# Altium footprint library MH_DA_THU_VIEN_16122016.PcbLib: 531 footprints (part 22 of 34)
Each footprint in its own frame and in the unit in brackets; x right, y up, seen from the top. Pads: shape width x height; smd on the part's side, far side on the other; paste and mask are expansions set on the pad; w line width, h text height; cw(c..) or ccw(c..) is an arc to the next point about the centre after c.
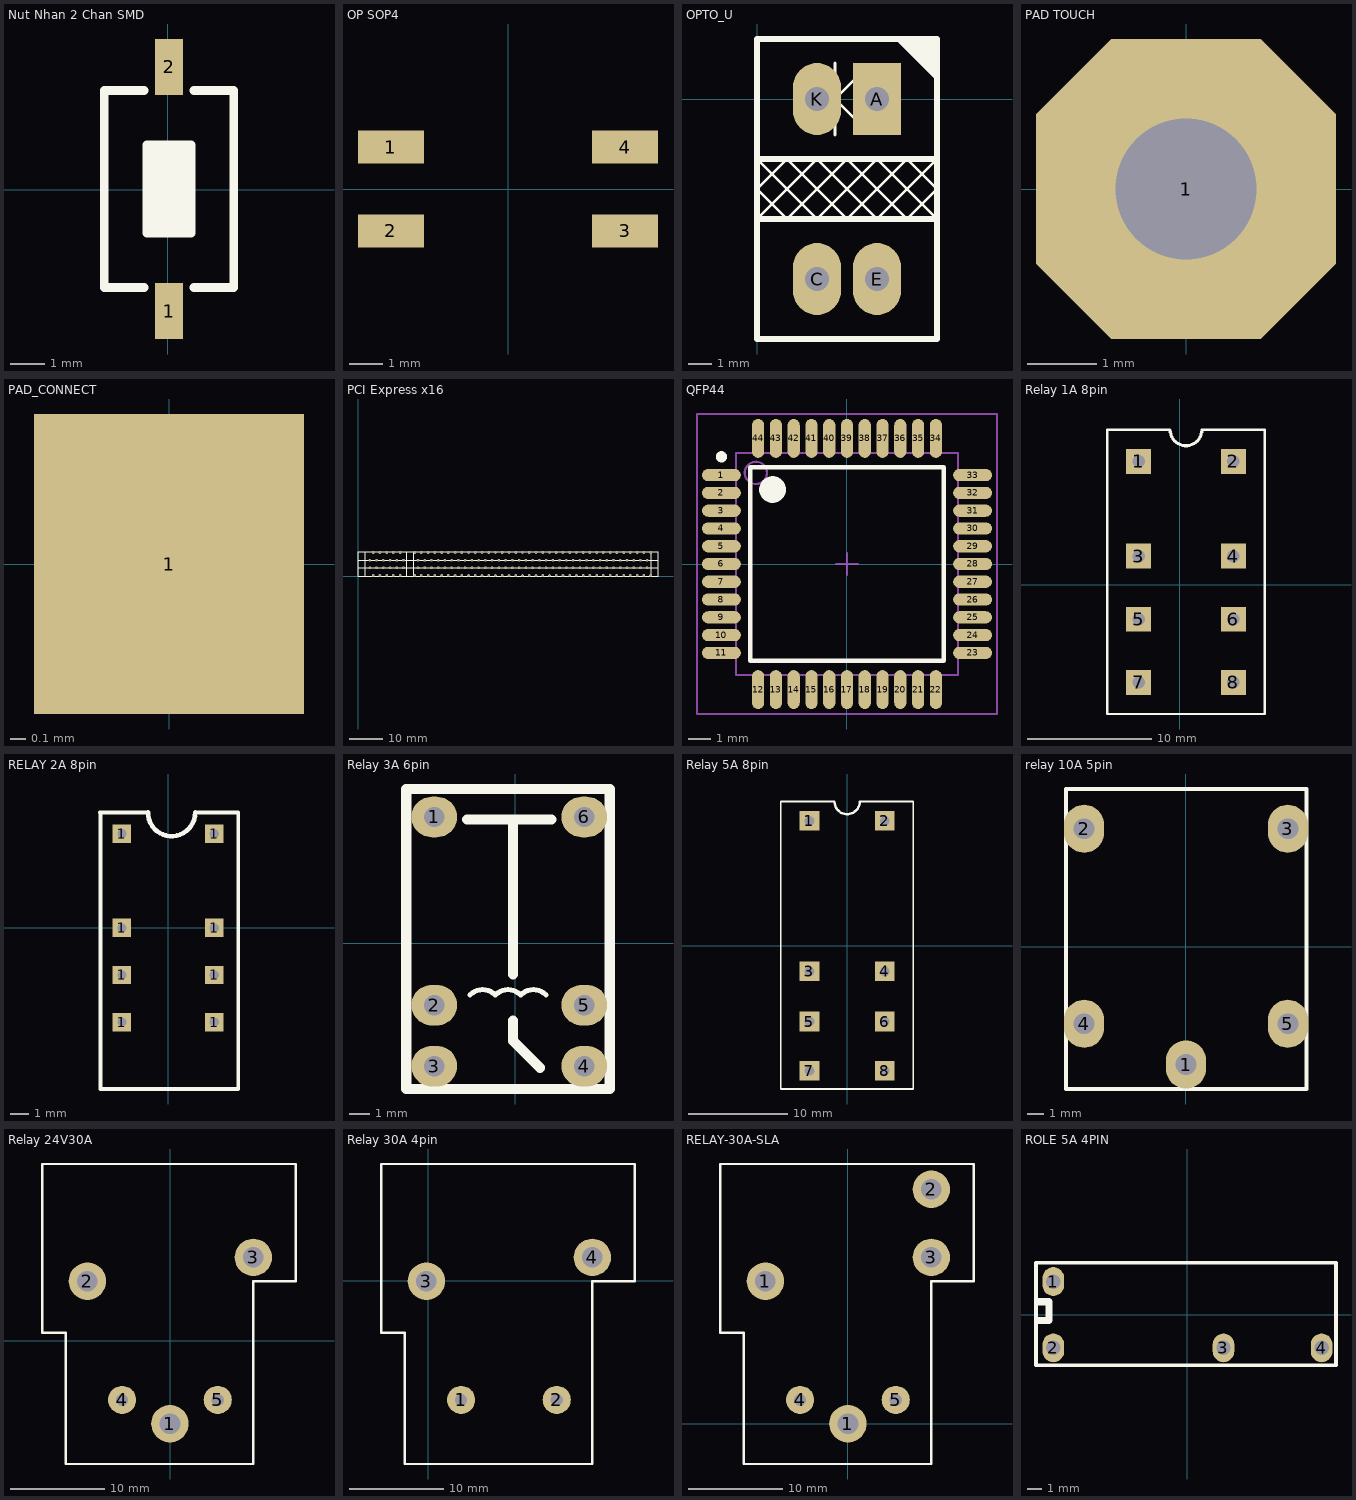
[diagram p21: the footprints below, top view; thin cyan lines are the x and y axes]

## Nut Nhan 2 Chan SMD [mm]
pads (2):
  rect 0.8x1.6 smd: 1(0.041,-3.484) 2(0.041,3.516)
Top Overlay:
  region: 0.676,-1.253 0.676,1.287 -0.594,1.287 -0.594,-1.253
  lines w0.254: -0.67,-2.803 -1.813,-2.803 -1.813,2.835 -0.67,2.835 ; 0.752,-2.803 1.895,-2.803 1.895,2.835 0.752,2.835 ; -0.594,-1.254 0.676,-1.254 0.676,1.286 -0.594,1.286 -0.594,-1.254
3D body: height 2.5, standoff 0, extent -1.809,-3.034 1.891,3.066

## OP SOP4 [mm]
pads (4):
  rect 2x1 smd: 1(-3.556,1.27) 2(-3.556,-1.27) 3(3.556,-1.27) 4(3.556,1.27)
3D body: height 4.57, standoff 0, extent -3.048,-2.54 3.048,2.54

## OPTO_U [mil] "Opto hinh chu U"
height 104.33
pads (4):
  rect 80x120 hole 40: A(200,0)
  oval 80x120 hole 40: C(100,-300) E(200,-300) K(100,0)
Top Overlay:
  region: 297.5,97.5 232.5,97.5 297.5,32.5
  lines w5: 0,-200 50,-150 100,-100 200,-200 230,-170 300,-100 300,-200 200,-100 100,-200 90,-190 60,-160 0,-100 ; 130,-60 130,60 ; 180,-50 180,50 ; 180,-50 180,50 ; 180,-50 130,0 180,50 ; 0,-150 30,-180 50,-200 150,-100 250,-200 300,-150 250,-100 150,-200 50,-100 0,-150
  lines w10: 0,-200 300,-200 ; 0,-150 0,-110 ; 0,-100 300,-100 ; 300,-150 300,-140 ; 0,-400 300,-400 300,100 0,100 0,-400
3D body: height 374.02, standoff -100, extent 43.46,-346.85 260,46.85

## PAD TOUCH [mil]
pads (1):
  oct 170x170 hole 80: 1(0,0)

## PAD_CONNECT [mm]
pads (1):
  rect 1.8x2 smd: 1(0,0)

## PCI Express x16 [mm]
pads (164):
  round 0.8 hole 0.5: 1(3.5,2.5) 2(4.5,0.2) 3(5.5,2.5) 4(6.5,0.2) 5(7.5,2.5) 6(8.5,0.2) 7(9.5,2.5) 8(10.5,0.2) 9(11.5,2.5) 10(12.5,0.2) 11(13.5,2.5) 12(16.8,0.2) 13(17.8,2.5) 14(18.8,0.2) 15(19.8,2.5) 16(20.8,0.2) 17(21.8,2.5) 18(22.8,0.2) 19(23.8,2.5) 20(24.8,0.2) 21(25.8,2.5) 22(26.8,0.2) 23(27.8,2.5) 24(28.8,0.2) 25(29.8,2.5) 26(30.8,0.2) 27(31.8,2.5) 28(32.8,0.2) 29(33.8,2.5) 30(34.8,0.2) 31(35.8,2.5) 32(36.8,0.2) 33(37.8,2.5) 34(38.8,0.2) 35(39.8,2.5) 36(40.8,0.2) 37(41.8,2.5) 38(42.8,0.2) 39(43.8,2.5) 40(44.8,0.2) 41(45.8,2.5) 42(46.8,0.2) 43(47.8,2.5) 44(48.8,0.2) 45(49.8,2.5) 46(50.8,0.2) 47(51.8,2.5) 48(52.8,0.2) 49(53.8,2.5) 50(54.8,0.2) 51(55.8,2.5) 52(56.8,0.2) 53(57.8,2.5) 54(58.8,0.2) 55(59.8,2.5) 56(60.8,0.2) 57(61.8,2.5) 58(62.8,0.2) 59(63.8,2.5) 60(64.8,0.2) 61(65.8,2.5) 62(66.8,0.2) 63(67.8,2.5) 64(68.8,0.2) 65(69.8,2.5) 66(70.8,0.2) 67(71.8,2.5) 68(72.8,0.2) 69(73.8,2.5) 70(74.8,0.2) 71(75.8,2.5) 72(76.8,0.2) 73(77.8,2.5) 74(78.8,0.2) 75(79.8,2.5) 76(80.8,0.2) 77(81.8,2.5) 78(82.8,0.2) 79(83.8,2.5) 80(84.8,0.2) 81(85.8,2.5) 82(86.8,0.2) A1(3.5,4.7) A2(4.5,7) A3(5.5,4.7) A4(6.5,7) A5(7.5,4.7) A6(8.5,7) A7(9.5,4.7) A8(10.5,7) A9(11.5,4.7) A10(12.5,7) A11(13.5,4.7) A12(16.8,7) A13(17.8,4.7) A14(18.8,7) A15(19.8,4.7) A16(20.8,7) A17(21.8,4.7) A18(22.8,7) A19(23.8,4.7) A20(24.8,7) A21(25.8,4.7) A22(26.8,7) A23(27.8,4.7) A24(28.8,7) A25(29.8,4.7) A26(30.8,7) A27(31.8,4.7) A28(32.8,7) A29(33.8,4.7) A30(34.8,7) A31(35.8,4.7) A32(36.8,7) A33(37.8,4.7) A34(38.8,7) A35(39.8,4.7) A36(40.8,7) A37(41.8,4.7) A38(42.8,7) A39(43.8,4.7) A40(44.8,7) A41(45.8,4.7) A42(46.8,7) A43(47.8,4.7) A44(48.8,7) A45(49.8,4.7) A46(50.8,7) A47(51.8,4.7) A48(52.8,7) A49(53.8,4.7) A50(54.8,7) A51(55.8,4.7) A52(56.8,7) A53(57.8,4.7) A54(58.8,7) A55(59.8,4.7) A56(60.8,7) A57(61.8,4.7) A58(62.8,7) A59(63.8,4.7) A60(64.8,7) A61(65.8,4.7) A62(66.8,7) A63(67.8,4.7) A64(68.8,7) A65(69.8,4.7) A66(70.8,7) A67(71.8,4.7) A68(72.8,7) A69(73.8,4.7) A70(74.8,7) A71(75.8,4.7) A72(76.8,7) A73(77.8,4.7) A74(78.8,7) A75(79.8,4.7) A76(80.8,7) A77(81.8,4.7) A78(82.8,7) A79(83.8,4.7) A80(84.8,7) A81(85.8,4.7) A82(86.8,7)
Top Overlay:
  lines w0.254: 0,2.5 89,2.5 89,4.7 0,4.7 ; 2.1,0 2.1,7.2 ; 16.5,0 16.5,7.2 ; 87,7.2 89,7.2 89,0 ; 87,7.2 87,0 89,0 ; 87,7.2 0,7.2 0,0 89,0 ; 14.5,0 14.5,7.2 14.5,0

## QFP44 [mm] "Thin QFP, 44-Leads, Body 10x10mm, Pitch 0.8mm, IPC Medium Density"
height 1.2
pads (44):
  oval 1.75x0.55 smd: 1(-5.65,4) 2(-5.65,3.2) 3(-5.65,2.4) 4(-5.65,1.6) 5(-5.65,0.8) 6(-5.65,0) 7(-5.65,-0.8) 8(-5.65,-1.6) 9(-5.65,-2.4) 10(-5.65,-3.2) 11(-5.65,-4) 23(5.65,-4) 24(5.65,-3.2) 25(5.65,-2.4) 26(5.65,-1.6) 27(5.65,-0.8) 28(5.65,0) 29(5.65,0.8) 30(5.65,1.6) 31(5.65,2.4) 32(5.65,3.2) 33(5.65,4)
  oval 0.55x1.75 smd: 12(-4,-5.65) 13(-3.2,-5.65) 14(-2.4,-5.65) 15(-1.6,-5.65) 16(-0.8,-5.65) 17(0,-5.65) 18(0.8,-5.65) 19(1.6,-5.65) 20(2.4,-5.65) 21(3.2,-5.65) 22(4,-5.65) 34(4,5.65) 35(3.2,5.65) 36(2.4,5.65) 37(1.6,5.65) 38(0.8,5.65) 39(0,5.65) 40(-0.8,5.65) 41(-1.6,5.65) 42(-2.4,5.65) 43(-3.2,5.65) 44(-4,5.65)
Top Overlay:
  circle w0.6: c-3.35,3.35 r0.3
  circle w0.25: c-5.65,4.825 r0.125
  lines w0.2: -4.35,-4.35 4.35,-4.35 4.35,4.35 -4.35,4.35 -4.35,-4.35
Mechanical 13:
  circle w0.1: c-4.1,4.1 r0.5
  lines w0.1: -5,-5 5,-5 5,5 -5,5 -5,-5
Mechanical 15:
  lines w0.1: -0.5,0 0.5,0 ; 0,-0.5 0,0.5 ; -6.75,-6.75 6.75,-6.75 6.75,6.75 -6.75,6.75 -6.75,-6.75

## Relay 1A 8pin [mm]
pads (8):
  rect 2x2 hole 1: 1(-3.3,9.94) 2(4.32,9.94) 3(-3.3,2.32) 4(4.32,2.32) 5(-3.3,-2.76) 6(4.32,-2.76) 7(-3.3,-7.84) 8(4.32,-7.84)
Top Overlay:
  lines w0.2: -0.887,12.48 -5.84,12.48 -5.84,-10.38 6.86,-10.38 6.86,12.48 1.78,12.48
  lines w0.254: -0.766,12.48 ccw(c0.51,12.48) 1.786,12.48
3D body: height 12.3, standoff -3, extent -4.39,-9.35 5.41,11.45

## RELAY 2A 8pin [mm]
pads (8):
  rect 1x1 hole 0.5: 1(-2.5,-5.1) 1(-2.5,-2.55) 1(-2.5,0) 1(-2.5,5.1) 1(2.5,-5.1) 1(2.5,-2.55) 1(2.5,0) 1(2.5,5.1)
Top Overlay:
  lines w0.2: -3.7,6.24 -1.207,6.24 ; -3.66,6.2 -3.66,-8.72 3.8,-8.72 3.8,6.2 ; 1.46,6.24 3.8,6.24
  lines w0.254: -1.086,6.24 ccw(c0.19,6.24) 1.466,6.24
3D body: height 9.2, standoff -2.95, extent -3.55,-8.7 3.75,6.1

## Relay 3A 6pin [mil]
pads (6):
  oval 90x80 hole 40: 1(-159.41,247.91) 2(-159.41,-122.09) 3(-159.41,-242.09) 4(135.59,-242.09) 5(135.59,-122.09) 6(135.59,247.91)
Top Overlay:
  lines w10: -89.41,-102.09 cw(c-64.41,-127.09) -39.41,-102.09 cw(c-14.41,-127.09) 10.59,-102.09 cw(c35.59,-127.09) 60.59,-102.09
  lines w20: -94.41,242.91 70.59,242.91 ; -4.41,-187.09 -4.41,-152.09 ; -4.41,-62.09 -4.41,242.91 ; -4.31,-191.09 -4.31,-192.59 48.49,-245.39 ; -214.41,-287.09 -214.41,302.91 185.59,302.91 185.59,-287.09 -214.41,-287.09
3D body: height 453.36, standoff 0.6, extent -214.33,-284.4 179.37,306.15

## Relay 5A 8pin [mm]
pads (8):
  rect 2x2 hole 1: 1(-3.81,12.64) 2(3.81,12.64) 3(-3.81,-2.58) 4(3.81,-2.58) 5(-3.81,-7.66) 6(3.81,-7.66) 7(-3.81,-12.64) 8(3.81,-12.64)
Top Overlay:
  lines w0.2: -1.397,14.58 -6.71,14.58 -6.71,-14.48 6.69,-14.48 6.69,14.58 1.27,14.58
  lines w0.254: -1.276,14.58 ccw(c0,14.58) 1.276,14.58
3D body: height 25.5, standoff -4, extent -6.66,-14.5 6.84,14.5

## relay 10A 5pin [mm]
pads (5):
  oval 2.5x3 hole 1.3: 1(0,-7.35) 2(-6.35,7.35) 3(6.35,7.35) 4(-6.35,-4.81) 5(6.35,-4.81)
Top Overlay:
  lines w0.254: -7.493,-8.874 -7.493,9.826 7.507,9.826 7.507,-8.874 -7.493,-8.874
3D body: height 16, standoff 0, extent -7.493,-8.874 7.493,9.795

## Relay 24V30A [mm]
pads (5):
  round 4 hole 2.2: 1(-0.05,-8.87) 2(-8.85,6.33) 3(8.85,8.87)
  round 3 hole 1.3: 4(-5.15,-6.33) 5(5.05,-6.33)
Top Overlay:
  lines w0.254: -11.15,0.83 -11.15,-13.17 8.85,-13.17 8.85,6.33 13.35,6.33 13.35,18.83 -13.65,18.83 -13.65,0.83 -11.15,0.83
3D body: height 19.71, standoff -3.29, extent -13.512,-13.237 13.488,18.763

## Relay 30A 4pin [mm]
pads (4):
  round 3 hole 1.3: 1(3.51,-12.69) 2(13.71,-12.69)
  round 4 hole 2.2: 3(-0.19,-0.03) 4(17.51,2.51)
Top Overlay:
  lines w0.254: -2.49,-5.53 -2.49,-19.53 17.51,-19.53 17.51,-0.03 22.01,-0.03 22.01,12.47 -4.99,12.47 -4.99,-5.53 -2.49,-5.53
3D body: height 19.71, standoff -3.29, extent -4.852,-19.597 22.148,12.403

## RELAY-30A-SLA [mm]
pads (6):
  round 4 hole 2.2: 1(-8.8,15.2) 1(0,0) 2(8.9,25) 3(8.9,17.74)
  round 3 hole 1.3: 4(-5.1,2.54) 5(5.1,2.54)
Top Overlay:
  lines w0.254: -13.6,9.7 -11.1,9.7 -11.1,-4.3 8.9,-4.3 8.9,15.2 13.4,15.2 13.4,27.7 -13.6,27.7 -13.6,9.7
3D body: height 19.71, standoff -3.29, extent -13.462,-4.367 13.538,27.633

## ROLE 5A 4PIN [mm]
pads (4):
  oval 1.5x2 hole 1: 1(-9.3,2.3) 2(-9.3,-2.3) 3(2.5,-2.3) 4(9.3,-2.3)
Top Overlay:
  lines w0.254: -10.5,-3.5 -10.5,3.6 10.3,3.6 10.3,-3.5 -10.5,-3.5
  lines w0.508: -10.4,0.9 -9.6,0.9 -9.6,-0.4 -10.3,-0.4
3D body: height 14.79, standoff -3.92, extent -10.4,-3.5 10,3.5